# Altium footprint library CMR_Miscellaneous_Devices.PcbLib: 103 footprints (part 6 of 7)
Each footprint in its own frame and in the unit in brackets; x right, y up, seen from the top. Pads: shape width x height; smd on the part's side, far side on the other; paste and mask are expansions set on the pad; w line width, h text height; cw(c..) or ccw(c..) is an arc to the next point about the centre after c.
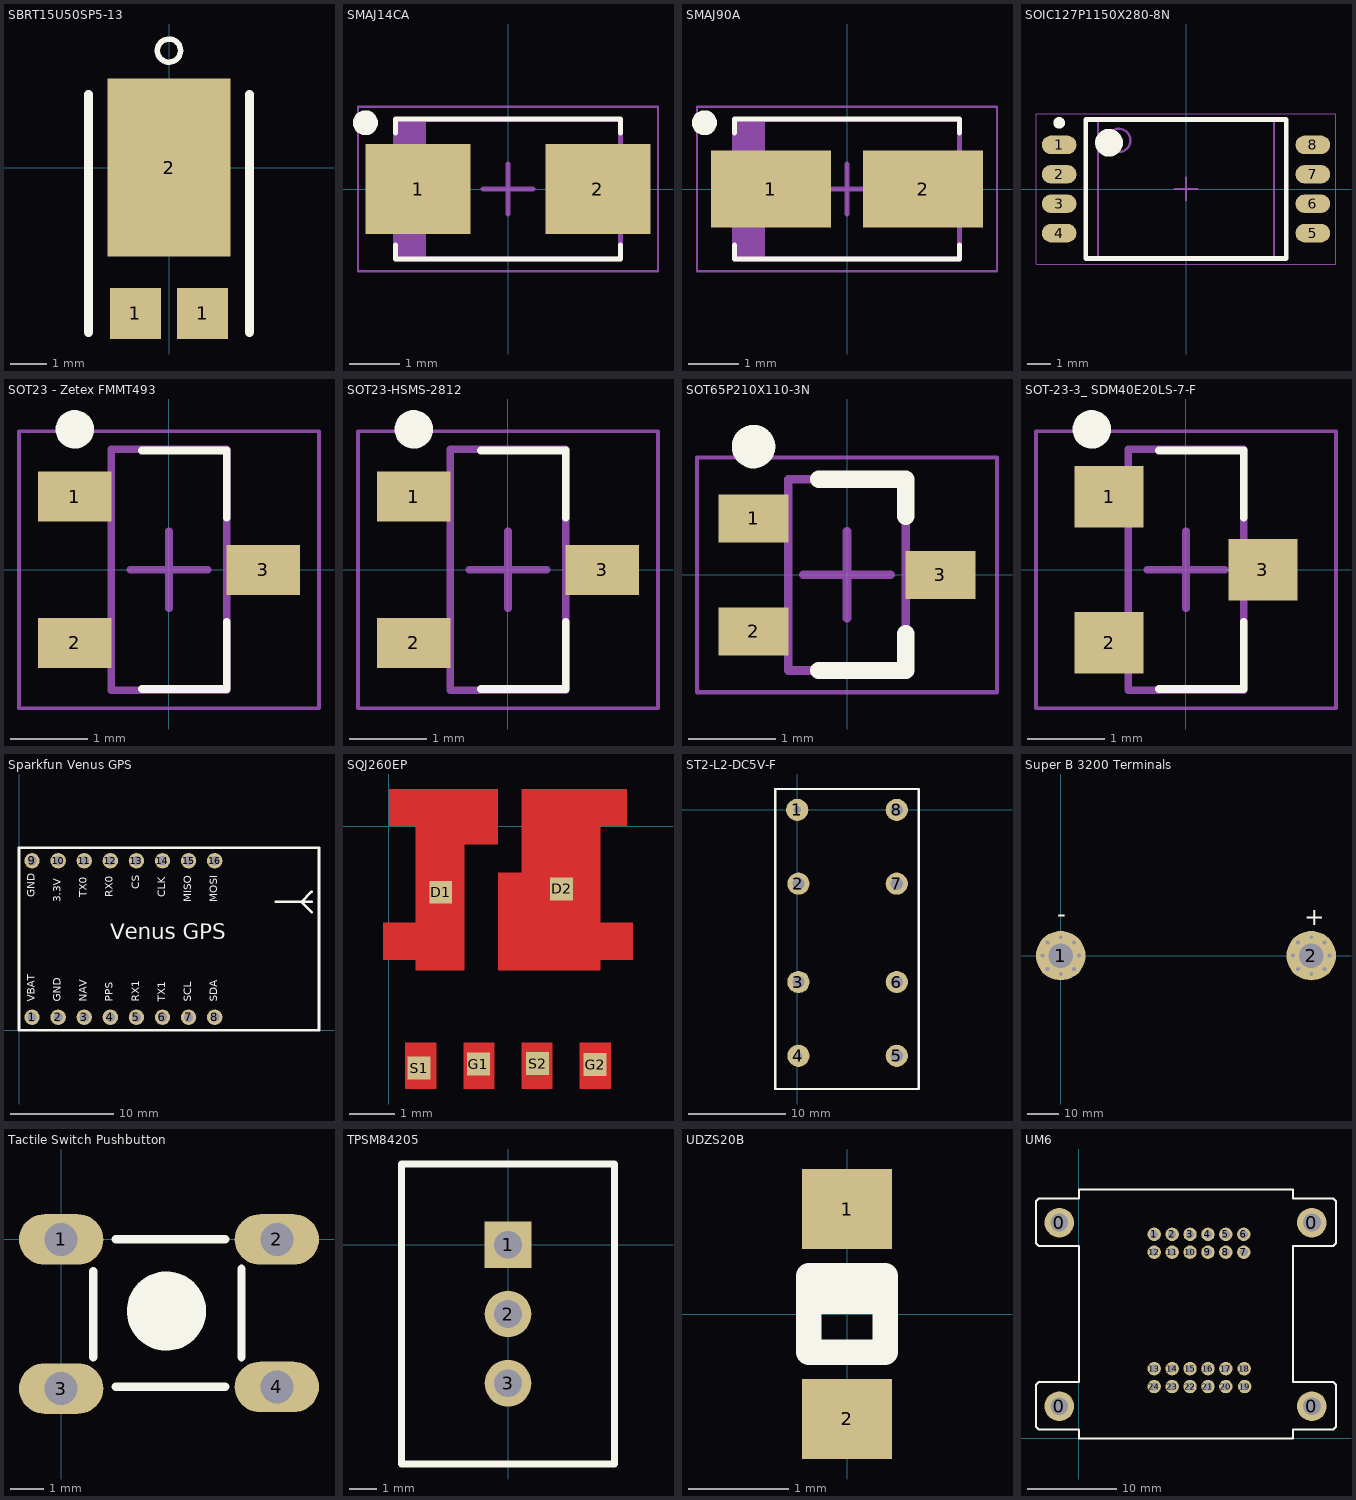
[diagram p5: the footprints below, top view; thin cyan lines are the x and y axes]

## SBRT15U50SP5-13 [mm]
pads (3):
  rect 1.39x1.4 smd: 1(-0.92,-3.982) 1(0.92,-3.982)
  rect 3.36x4.86 smd: 2(0,0)
Top Overlay:
  circle w0.15: c0,3.2 r0.316
  lines w0.254: -2.2,-4.5 -2.2,2 ; 2.2,-4.5 2.2,2
3D body: height 1.05, standoff 0.1, extent -2,-4.2 2,1.7
3D body: height 0.25, standoff 0, extent 0.2,-4.6 1.6,-3.3
3D body: height 0.25, standoff 0, extent -1.6,-4.6 -0.2,-3.3
3D body: height 0.25, standoff 0, extent -1.6,-2.3 1.6,2.4

## SMAJ14CA [mm] "Molded Diode, 2-Leads, Body 4.25x2.67mm, IPC Medium Density"
height 2.29
pads (2):
  rect 2.1x1.8 smd: 1(-1.8,0) 2(1.8,0)
Top Overlay:
  circle w0.25: c-2.85,1.325 r0.125
  lines w0.1: -2.25,-1.125 -2.25,-1.4 2.25,-1.4 2.25,-1.125 ; -2.25,1.125 -2.25,1.4 2.25,1.4 2.25,1.125
Mechanical 13:
  rectangle: -2.25,-1.395 -1.645,1.395
  lines w0.1: -2.25,-1.395 2.25,-1.395 2.25,1.395 -2.25,1.395 -2.25,-1.395
Mechanical 15:
  lines w0.05: -3,-1.65 3,-1.65 3,1.65 -3,1.65 -3,-1.65
  lines w0.1: -0.5,0 0.5,0 ; 0,-0.5 0,0.5
3D body "DIOM4227X23N.step": height 2.29, standoff 0, extent -2.47,-1.395 2.47,1.395

## SMAJ90A [mm] "Molded Diode, 2-Leads, Body 4.25x2.67mm, IPC Medium Density"
height 2.29
pads (2):
  rect 2.4x1.55 smd: 1(-1.525,0) 2(1.525,0)
Top Overlay:
  circle w0.25: c-2.85,1.325 r0.125
  lines w0.1: -2.25,-1.125 -2.25,-1.4 2.25,-1.4 2.25,-1.125 ; -2.25,1.125 -2.25,1.4 2.25,1.4 2.25,1.125
Mechanical 13:
  rectangle: -2.25,-1.395 -1.645,1.395
  lines w0.1: -2.25,-1.395 2.25,-1.395 2.25,1.395 -2.25,1.395 -2.25,-1.395
Mechanical 15:
  lines w0.05: -3,-1.65 3,-1.65 3,1.65 -3,1.65 -3,-1.65
  lines w0.1: -0.5,0 0.5,0 ; 0,-0.5 0,0.5
3D body "DIOM4227X23N.step": height 2.29, standoff 0, extent -2.47,-1.395 2.47,1.395

## SOIC127P1150X280-8N [mm] "SOIC, 8-Leads, Body 5.85x7.50mm, Pitch 1.27mm, IPC Medium Density"
height 2.8
pads (8):
  oval 1.5x0.8 smd: 1(-5.475,1.905) 2(-5.475,0.635) 3(-5.475,-0.635) 4(-5.475,-1.905) 5(5.475,-1.905) 6(5.475,-0.635) 7(5.475,0.635) 8(5.475,1.905)
Top Overlay:
  circle w0.6: c-3.325,2 r0.3
  circle w0.25: c-5.475,2.855 r0.125
  lines w0.2: -4.325,-3 4.325,-3 4.325,3 -4.325,3 -4.325,-3
Mechanical 13:
  circle w0.1: c-2.9,2.1 r0.5
  lines w0.1: -3.8,-3 3.8,-3 3.8,3 -3.8,3 -3.8,-3
Mechanical 15:
  lines w0.05: -6.475,-3.25 6.475,-3.25 6.475,3.25 -6.475,3.25 -6.475,-3.25
  lines w0.1: -0.5,0 0.5,0 ; 0,-0.5 0,0.5
3D body "SOIC127P1150X280-8N.step": height 2.8, standoff 0, extent -5.75,-3 5.75,3

## SOT23 - Zetex FMMT493 [mm] "SOT23, 3-Leads, Body 2.93x2.40mm, Pitch 0.95mm, IPC Medium Density"
height 1.2
pads (3):
  rect 0.95x0.65 smd: 1(-1.225,0.95) 2(-1.225,-0.95) 3(1.225,0)
Top Overlay:
  circle w0.25: c-1.225,1.825 r0.125
  lines w0.1: -0.35,-1.55 0.75,-1.55 0.75,-0.675 ; -0.35,1.55 0.75,1.55 0.75,0.675
Mechanical 13:
  lines w0.1: -0.75,-1.565 0.75,-1.565 0.75,1.565 -0.75,1.565 -0.75,-1.565
Mechanical 15:
  lines w0.05: -1.95,-1.8 1.95,-1.8 1.95,1.8 -1.95,1.8 -1.95,-1.8
  lines w0.1: -0.5,0 0.5,0 ; 0,-0.5 0,0.5
3D body "SOT23-HSMS-2812.step": height 1.2, standoff 0, extent -1.35,-1.565 1.35,1.565

## SOT23-HSMS-2812 [mm] "SOT23, 3-Leads, Body 2.93x2.40mm, Pitch 0.95mm, IPC Medium Density"
height 1.2
pads (3):
  rect 0.95x0.65 smd: 1(-1.225,0.95) 2(-1.225,-0.95) 3(1.225,0)
Top Overlay:
  circle w0.25: c-1.225,1.825 r0.125
  lines w0.1: -0.35,-1.55 0.75,-1.55 0.75,-0.675 ; -0.35,1.55 0.75,1.55 0.75,0.675
Mechanical 13:
  lines w0.1: -0.75,-1.565 -0.75,1.565 0.75,1.565 0.75,-1.565 -0.75,-1.565
Mechanical 15:
  lines w0.05: -1.95,-1.8 -1.95,1.8 1.95,1.8 1.95,-1.8 -1.95,-1.8
  lines w0.1: -0.5,0 0.5,0 ; 0,-0.5 0,0.5
3D body "SOT23-HSMS-2812.step": height 1.2, standoff 0, extent -1.35,-1.565 1.35,1.565

## SOT65P210X110-3N [mm] "SOT23, 3-Leads, Body 2.00x2.10mm, Pitch 0.65mm, IPC Medium Density"
height 1.1
pads (3):
  rect 0.8x0.55 smd: 1(-1.075,0.65) 2(-1.075,-0.65) 3(1.075,0)
Top Overlay:
  circle w0.25: c-1.075,1.475 r0.125
  lines w0.2: -0.325,-1.1 0.675,-1.1 0.675,-0.675 ; -0.325,1.1 0.675,1.1 0.675,0.675
Mechanical 13:
  lines w0.1: -0.675,-1.1 0.675,-1.1 0.675,1.1 -0.675,1.1 -0.675,-1.1
Mechanical 15:
  lines w0.05: -1.725,-1.35 1.725,-1.35 1.725,1.35 -1.725,1.35 -1.725,-1.35
  lines w0.1: -0.5,0 0.5,0 ; 0,-0.5 0,0.5
3D body "SOT65P210X110-3N.step": height 1.1, standoff 0, extent -1.15,-1.1 1.15,1.1

## SOT-23-3_ SDM40E20LS-7-F [mm] "SOT23, 3-Leads, Body 2.93x2.40mm, Pitch 0.95mm, IPC Medium Density"
height 1.2
pads (3):
  rect 0.9x0.8 smd: 1(-1,0.95) 2(-1,-0.95) 3(1,0)
Top Overlay:
  circle w0.25: c-1.225,1.825 r0.125
  lines w0.1: -0.35,-1.55 0.75,-1.55 0.75,-0.675 ; -0.35,1.55 0.75,1.55 0.75,0.675
Mechanical 13:
  lines w0.1: -0.75,-1.565 -0.75,1.565 0.75,1.565 0.75,-1.565 -0.75,-1.565
Mechanical 15:
  lines w0.05: -1.95,-1.8 -1.95,1.8 1.95,1.8 1.95,-1.8 -1.95,-1.8
  lines w0.1: -0.5,0 0.5,0 ; 0,-0.5 0,0.5
3D body "SOT23-HSMS-2812.step": height 1.2, standoff 0, extent -1.35,-1.565 1.35,1.565

## Sparkfun Venus GPS [mm] "Sparkfun Venus GPS Module"
height 4
pads (16):
  round 1.5 hole 0.9: 1(1.27,1.27) 2(3.81,1.27) 3(6.35,1.27) 4(8.89,1.27) 5(11.43,1.27) 6(13.97,1.27) 7(16.51,1.27) 8(19.05,1.27) 9(1.27,16.51) 10(3.81,16.51) 11(6.35,16.51) 12(8.89,16.51) 13(11.43,16.51) 14(13.97,16.51) 15(16.51,16.51) 16(19.05,16.51)
Top Overlay:
  lines w0.254: 25,12.5 27.5,12.5 ; 28.5,11.5 27.5,12.5 ; 28.5,12.5 27.5,12.5 ; 28.5,13.5 27.5,12.5 ; 29.21,17.78 29.21,17.78 ; 29.21,17.78 29.21,0 0,0 0,17.78 29.21,17.78
  text "Venus GPS" at 8.89,8.89 h1.52
  text "VBAT" at 1.524,2.794 h0.76
  text "GND" at 4.064,2.794 h0.76
  text "NAV" at 6.604,2.794 h0.76
  text "PPS" at 9.144,2.794 h0.76
  text "RX1" at 11.684,2.794 h0.76
  text "TX1" at 14.224,2.794 h0.76
  text "SCL" at 16.764,2.794 h0.76
  text "SDA" at 19.304,2.794 h0.76
  text "GND" at 1.524,12.954 h0.76
  text "3.3V" at 4.064,12.446 h0.76
  text "TX0" at 6.604,12.954 h0.76
  text "RX0" at 9.144,12.954 h0.76
  text "CS" at 11.684,13.716 h0.76
  text "CLK" at 14.224,12.954 h0.76
  text "MISO" at 16.764,12.446 h0.76
  text "MOSI" at 19.304,12.446 h0.76
3D body "VenusGPSAss.STEP": height 15.23, standoff 9.15, extent 0,0 37.71,17.78
3D body "Pin Header 1x4 TH Pitch 2.54mm.stp": height 14.63, standoff 1.93, extent 0,0 10.16,2.54
3D body "Header_4.stp": height 8.5, standoff -2.09, extent 0,0 10.16,2.54
3D body "Pin Header 1x4 TH Pitch 2.54mm.stp": height 14.63, standoff 1.93, extent 10.16,0 20.32,2.54
3D body "Pin Header 1x4 TH Pitch 2.54mm.stp": height 14.63, standoff 1.93, extent 0,15.24 10.16,17.78
3D body "Pin Header 1x4 TH Pitch 2.54mm.stp": height 14.63, standoff 1.93, extent 10.16,15.24 20.32,17.78
3D body "Header_4.stp": height 8.5, standoff -2.09, extent 10.16,0 20.32,2.54
3D body "Header_4.stp": height 8.5, standoff -2.09, extent 0,15.24 10.16,17.78
3D body "Header_4.stp": height 8.5, standoff -2.09, extent 10.16,15.24 20.32,17.78

## SQJ260EP [mm] "Automotive Dual N-Channel 60 V (D-S) 175 °C MOSFETs"
pads (6):
  rect 0.5x0.5 smd: D1(1.132,-1.444) D2(3.771,-1.371) G1(1.955,-5.198) G2(4.502,-5.207) S1(0.661,-5.285) S2(3.245,-5.185)
Top Layer:
  rectangle: 0,0 2.385,0.81
  rectangle: 0.585,-0.4 2.385,0.117
  rectangle: 0.585,-3.15 1.645,-0.3
  rectangle: -0.125,-2.92 0.697,-2.11
  rectangle: 0.355,-5.74 1.035,-4.72
  rectangle: 1.625,-5.74 2.305,-4.72
  rectangle: 2.895,-5.74 3.575,-4.72
  rectangle: 4.165,-5.74 4.845,-4.72
  rectangle: 2.385,-3.15 2.993,-1.01
  rectangle: 2.385,-2.92 4.615,-2.11
  rectangle: 2.385,-3.15 4.615,-2.742
  rectangle: 4.426,-2.92 5.325,-2.11
  rectangle: 2.895,-2.208 4.615,0.175
  rectangle: 2.895,0 5.2,0.81
3D body: height 1.14, standoff 0, extent -0.121,-5.754 5.329,0.826

## ST2-L2-DC5V-F [mil]
pads (8):
  round 90 hole 30: 1(0,0) 4(5,-1000)
  round 90 hole 50: 2(5,-300) 3(5,-700) 5(405,-1000) 6(405,-700) 7(405,-300) 8(405,0)
Top Overlay:
  lines w10: -25,85 495,85 495,-1135 -90,-1135 -90,85 5,85
3D body: height 444.88, standoff 11.81, extent -100,-1145 500,95

## Super B 3200 Terminals [mm] "Plated mounting holes to place on top of Super B 3200 and screw onto it. M5 Screws, 3.072\" center-to-center spacing"
pads (2):
  round 16 hole 8: 1(0,0) 2(81,0)
via 85.326,-4.326 diameter 2.54 hole 1.27
via 76.674,-4.326 diameter 2.54 hole 1.27
via 76.674,4.326 diameter 2.54 hole 1.27
via 85.326,4.326 diameter 2.54 hole 1.27
via 81,5.962 diameter 2.54 hole 1.27
via 75.038,0 diameter 2.54 hole 1.27
via 81,-5.962 diameter 2.54 hole 1.27
via 86.862,0 diameter 2.54 hole 1.27
via 5.962,0 diameter 2.54 hole 1.27
via 0,-5.962 diameter 2.54 hole 1.27
via -5.962,0 diameter 2.54 hole 1.27
via 0,5.962 diameter 2.54 hole 1.27
via 4.326,4.326 diameter 2.54 hole 1.27
via -4.326,4.326 diameter 2.54 hole 1.27
via -4.326,-4.326 diameter 2.54 hole 1.27
via 4.326,-4.326 diameter 2.54 hole 1.27
Top Overlay:
  text "-" at -1.209,8.796 h10
  text "+" at 78.76,7.953 h10

## Tactile Switch Pushbutton [mil]
height 200
pads (4):
  oval 100x60 hole 39: 1(0,0) 2(256,0) 3(0,-177) 4(256,-175)
Top Overlay:
  circle w50: c125,-85 r21.95
  lines w10: 38,-140 38,-38 ; 65,-175 195,-175 ; 65,0 195,0 ; 214,-140 214,-35
3D body "Button-PTH.STEP": height 173.62, standoff 0, extent 10,-206.11 246.22,30.11

## TPSM84205 [mm]
pads (3):
  rect 1.71x1.71 hole 1.01: 1(0,0)
  round 1.71 hole 1.01: 2(0,-2.54) 3(0,-5.08)
Top Overlay:
  lines w0.254: -3.9,-8.04 -3.9,2.96 3.9,2.96 3.9,-8.04 -3.9,-8.04
3D body: height 11.1, standoff 0, extent -3.937,-8.001 3.81,2.921

## UDZS20B [mm] "20v Zener"
pads (2):
  rect 0.9x0.8 smd: 1(0,1.05) 2(0,-1.05)
Top Overlay:
  lines w0.254: -0.381,0.127 -0.381,-0.381 0.381,-0.381 0.381,0.127 ; -0.381,0.127 0.381,0.127 ; -0.381,0.127 -0.381,0.381 ; -0.381,0.381 0.381,0.381 ; -0.381,0.381 0.381,0.381 ; 0.381,0.127 0.381,0.381
3D body: height 0.7, standoff 0.02, extent -0.625,-0.85 0.625,0.85

## UM6 [mm]
pads (28):
  round 3.3 hole 2: 0(-2.2,3.6) 0(-2.2,24.1) 0(26,3.6) 0(26,24.1)
  round 1.5 hole 0.9: 1(8.4,22.8) 2(10.4,22.8) 3(12.4,22.8) 4(14.4,22.8) 5(16.4,22.8) 6(18.4,22.8) 7(18.4,20.8) 8(16.4,20.8) 9(14.4,20.8) 10(12.4,20.8) 11(10.4,20.8) 12(8.4,20.8) 13(8.4,7.8) 14(10.4,7.8) 15(12.4,7.8) 16(14.4,7.8) 17(16.4,7.8) 18(18.45,7.8) 19(18.5,5.8) 20(16.4,5.8) 21(14.4,5.8) 22(12.4,5.8) 23(10.4,5.8) 24(8.4,5.8)
Top Overlay:
  lines w0.254: -4.8,1.3 -4.5,1 0,1 0,0 23.9,0 23.9,1 28.4,1 28.7,1.3 28.7,6 28.4,6.3 23.9,6.3 23.9,21.5 28.4,21.5 28.7,21.8 28.7,26.5 28.4,26.8 23.9,26.8 23.9,27.8 0,27.8 0,26.8 -4.5,26.8 -4.8,26.5 -4.8,21.8 -4.5,21.5 0,21.5 0,6.3 -4.5,6.3 -4.8,6 -4.8,1.3
3D body: height 2.3, standoff 0, extent 23.8,21.4 28.6,26.7
3D body: height 2.3, standoff 0, extent 23.8,0.9 28.6,6.2
3D body: height 2.3, standoff 0, extent -4.8,1 0,6.3
3D body: height 2.3, standoff 0, extent -4.8,21.5 0,26.8
3D body: height 11.5, standoff 0, extent 0,0 23.9,27.7
3D body: height 1, standoff 0, extent -3.908,22.4 -0.492,25.804
3D body: height 1, standoff 0, extent -3.908,1.898 -0.492,5.302
3D body: height 1, standoff 0, extent 24.292,1.898 27.708,5.302
3D body: height 1, standoff 0, extent 24.292,22.398 27.708,25.802